# Altium footprint library Library.PcbLib: 225 footprints (part 16 of 16)
Each footprint in its own frame and in the unit in brackets; x right, y up, seen from the top. Pads: shape width x height; smd on the part's side, far side on the other; paste and mask are expansions set on the pad; w line width, h text height; cw(c..) or ccw(c..) is an arc to the next point about the centre after c.
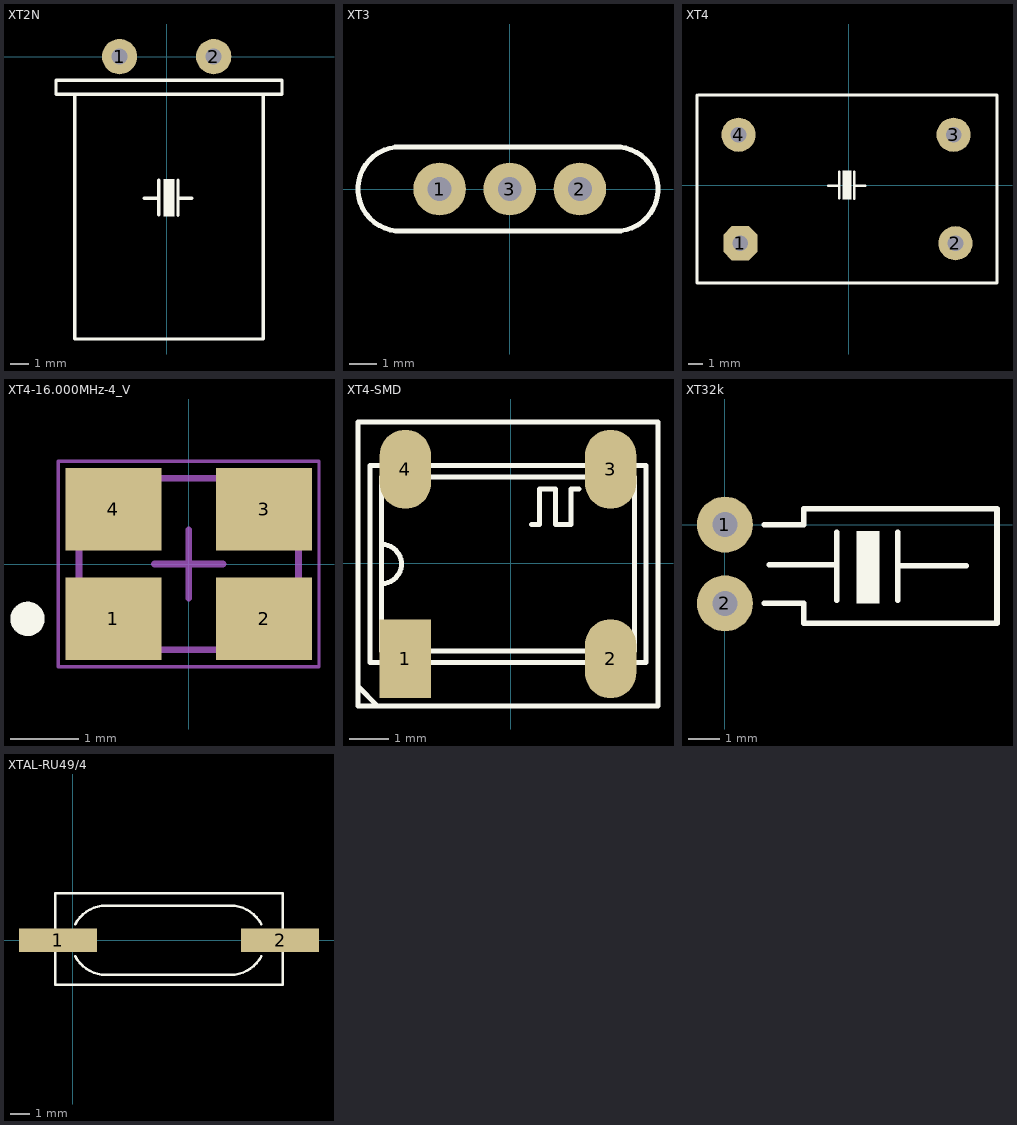
[diagram p15: the footprints below, top view; thin cyan lines are the x and y axes]

## XT2N [mil] "Crystal 2pin, high 200 mil"
height 200
pads (2):
  round 75 hole 34: 1(-100,0) 2(100,0)
Top Overlay:
  region: 16.5,-260 16.5,-339 -6.5,-339 -6.5,-260
  lines w7: -48,-301 -17,-301 ; -17,-336 -17,-262 ; 24,-337 24,-262 ; 24,-301 54,-301 ; -235,-80 -195,-80 ; -235,-80 -235,-50 ; -235,-80 -195,-80 ; -235,-80 -235,-50 ; -235,-50 245,-50 ; -235,-50 245,-50 ; -195,-600 -195,-80 ; -195,-600 205,-600 ; -195,-600 -195,-80 ; -195,-600 205,-600 ; -195,-80 205,-80 ; -195,-80 205,-80 ; 205,-600 205,-80 ; 205,-600 205,-80 ; 205,-80 245,-80 ; 205,-80 245,-80 ; 245,-80 245,-50 ; 245,-80 245,-50
3D body "User Library-MCCOY_R60.step": height 132.28, standoff 0, extent -145.99,-432.49 156.37,32.51
3D body "SW3dPS-HC49U.STEP": height 91.44, standoff -92.52, extent -209.86,-594.33 230,14.33

## XT3 [mil]
pads (3):
  round 75 hole 34: 1(-100,0) 2(100,0) 3(0,0)
Top Overlay:
  lines w7: 149.38,59.95 cw(c151.36,-0.02) 150,-60 -154.38,-59.95 cw(c-156.36,0.02) -155,60 149.38,60
3D body "User Library-XTAL2.step": height 126.52, standoff -95.28, extent -212,-60 208,60

## XT4 [mm]
pads (4):
  oct 2.4x2.4 hole 1.1: 1(-7.62,-4.064)
  round 2.4 hole 1.1: 2(7.493,-4.064) 3(7.366,3.556) 4(-7.747,3.556)
Top Overlay:
  region: 0.165,1.016 0.165,-0.991 -0.419,-0.991 -0.419,1.016
  lines w0.178: -1.448,-0.025 -0.66,-0.025 ; -0.66,-0.914 -0.66,0.965 ; 0.381,-0.94 0.381,0.965 ; 0.381,-0.025 1.143,-0.025
  lines w0.2: -10.668,6.35 -10.668,-6.858 10.414,-6.858 10.414,6.35 -10.541,6.35
3D body "User Library-osilator.step": height 7.27, standoff -5, extent -10.527,-6.794 10.273,6.286

## XT4-16.000MHz-4_V [mm] "Hand Drawn, 4-Leads, Body 3.2x2.5 mm"
height 0.9
pads (4):
  rect 1.4x1.2 smd: 1(-1.1,-0.8) 2(1.1,-0.8) 3(1.1,0.8) 4(-1.1,0.8)
Top Overlay:
  circle w0.25: c-2.35,-0.8 r0.125
Mechanical 13:
  lines w0.1: -1.6,-1.25 -1.6,1.25 1.6,1.25 1.6,-1.25 -1.6,-1.25
Mechanical 15:
  lines w0.05: -1.9,-1.5 -1.9,1.5 1.9,1.5 1.9,-1.5 -1.9,-1.5
  lines w0.1: -0.5,0 0.5,0 ; 0,-0.5 0,0.5
3D body: height 0.9, standoff 0, extent -1.6,-1.25 1.6,1.25

## XT4-SMD [mm]
pads (4):
  rect 1.3x2 smd: 1(-2.667,-2.413)
  oval 1.3x2 smd: 2(2.533,-2.413) 3(2.533,2.387) 4(-2.667,2.387)
Top Overlay:
  lines w0.127: -3.867,-3.313 -3.867,-3.113 -3.367,-3.613 -3.267,-3.613 ; -3.267,-0.513 ccw(c-3.267,-0.013) -3.267,0.487 ; 0.533,0.987 0.733,0.987 0.733,1.887 1.133,1.887 1.133,0.987 1.533,0.987 1.533,1.887 1.733,1.887 ; -3.867,-3.613 0.833,-3.613 3.733,-3.613 3.733,3.587 -3.867,3.587 -3.867,-3.613 ; -3.567,-2.513 -3.567,2.487 3.433,2.487 3.433,-2.513 -3.567,-2.513 ; -3.267,-2.213 -3.267,2.187 3.133,2.187 3.133,-2.213 -3.267,-2.213
3D body: height 2.03, standoff 1.3, extent -3.048,-1.905 2.921,1.905
3D body: height 1.3, standoff 1.27, extent -3.175,-2.032 3.048,2.032
3D body: height 1.3, standoff 0, extent 2.081,-2.502 2.996,-2.121
3D body: height 1.3, standoff 0, extent -3.119,-2.503 -2.204,-1.778
3D body: height 1.3, standoff 0, extent -3.13,2.095 -2.215,2.476
3D body: height 1.3, standoff 0, extent 2.07,2.095 2.984,2.476
3D body: height 1.27, standoff 0, extent -3.581,-2.489 3.429,2.464

## XT32k [mm]
pads (2):
  round 1.8 hole 0.813: 1(0,0) 2(0,-2.54)
Top Overlay:
  rectangle: 4.242,-2.54 4.978,-0.203
  lines w0.178: 1.27,-2.54 2.54,-2.54 2.54,-3.175 8.763,-3.175 8.763,0.508 2.54,0.508 2.54,0 1.27,0 ; 1.422,-1.295 3.607,-1.295 ; 3.607,-2.438 3.607,-0.254 ; 5.563,-2.438 5.563,-0.254 ; 5.588,-1.321 7.772,-1.321
3D body "User Library-KX-26.step": height 1.95, standoff -2, extent -0.145,-2.42 8.205,-0.12

## XTAL-RU49/4 [mm]
pads (2):
  rect 4x1.2 smd: 1(-0.762,0) 2(10.668,0)
Top Overlay:
  lines w0.127: 0.127,-0.825 ccw(c1.702,0) 1.702,-1.778 ; 0.127,0.825 cw(c1.702,0) 1.702,1.778 ; 1.651,-1.787 8.137,-1.787 ; 1.651,1.778 8.128,1.778 cw(c8.128,0) 9.703,0.825 ; 8.128,-1.778 ccw(c8.128,0) 9.703,-0.825 ; -0.889,-2.286 10.795,-2.286 10.795,2.413 -0.889,2.413 -0.889,-2.286
3D body "User Library-HC-49S.step": height 4.3, standoff -0.05, extent -1.197,-2.223 11.103,2.477